# Altium footprint library MidFlg_V1_Hwork.PcbLib: 34 footprints (part 1 of 3)
Each footprint in its own frame and in the unit in brackets; x right, y up, seen from the top. Pads: shape width x height; smd on the part's side, far side on the other; paste and mask are expansions set on the pad; w line width, h text height; cw(c..) or ccw(c..) is an arc to the next point about the centre after c.
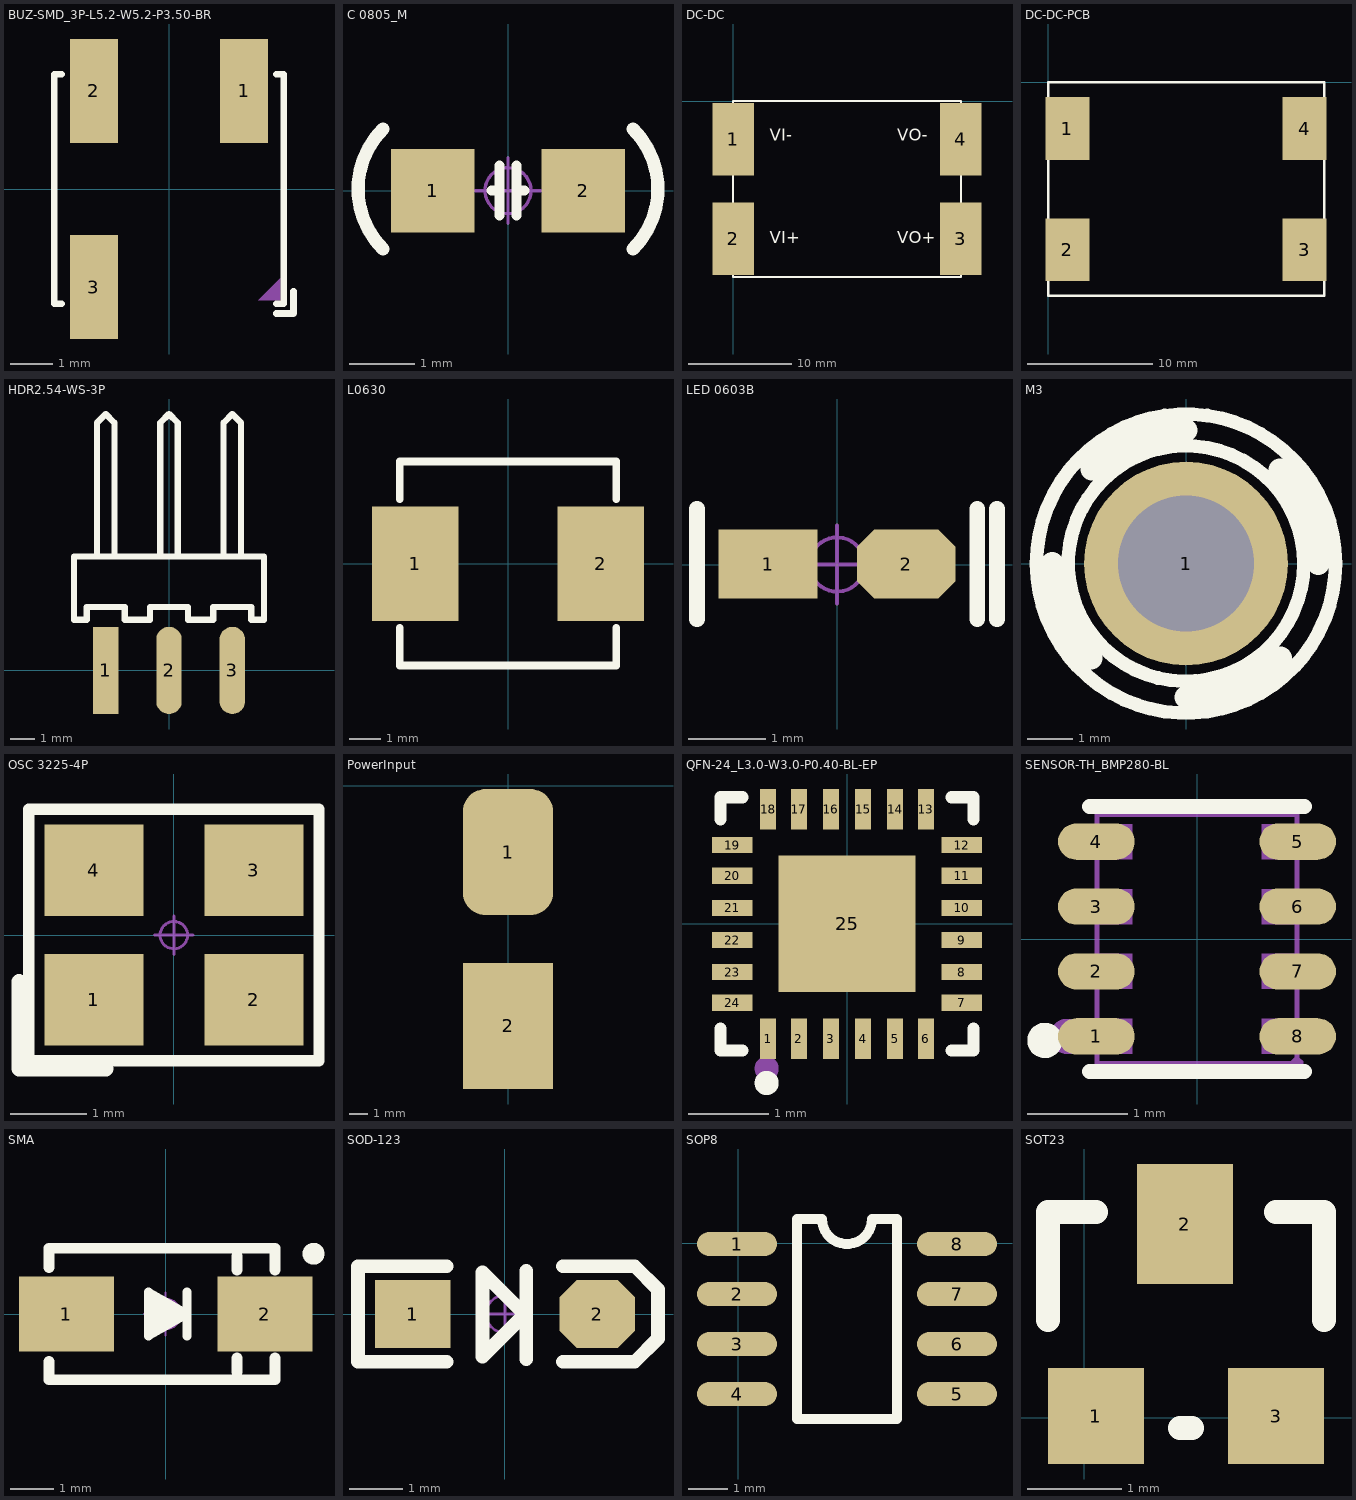
[diagram p0: the footprints below, top view; thin cyan lines are the x and y axes]

## BUZ-SMD_3P-L5.2-W5.2-P3.50-BR [mm]
pads (3):
  rect 1.12x2.425 smd: 1(1.75,2.287) 2(-1.75,2.287) 3(-1.75,-2.287)
Top Overlay:
  lines w0.152: -2.501,-2.676 -2.676,-2.676 -2.676,2.676 -2.501,2.676 ; 2.501,-2.905 2.829,-2.905 2.905,-2.905 2.905,-2.385 ; 2.501,-2.676 2.676,-2.676 2.676,2.676 2.501,2.676
Mechanical 15:
  region: 2.6,-2.6 2.6,-2.08 2.08,-2.6
3D body "MLT-5020.step": height 2.01, standoff 0, extent -2.62,-2.6 2.645,2.6

## C 0805_M [mil] "无极性贴片电容                                         淘宝ID:黄晶宝石"
height 19.68
pads (2):
  rect 50x50 smd: 1(-45,0) 2(45,0)
Top Overlay:
  lines w6: -10,0 -5,0 ; -5,-15 -5,15 ; 5,-15 5,15 ; 5,0 10,0
  lines w7.87: -75,-35 cw(c-39,1) -75,37 ; 75,-35 ccw(c39,1) 75,37
Mechanical 15:
  circle w1.97: c0,0 r13.78
  lines w1.97: -19.68,0 19.68,0 ; 0,-19.68 0,19.68
3D body "C 0805.STEP": height 20.08, standoff -0.39, extent -39.37,-24.02 39.37,24.02

## DC-DC [mm]
pads (4):
  rect 4x7 smd: 1(0,-3.683) 2(0,-13.317) 3(22,-13.317) 4(22,-3.683)
Top Overlay:
  lines w0.2: 0,-17 22,-17 22,0 0,0 0,-17
  text "VI-" at 3.556,-4.222 h2
  text "VI+" at 3.556,-14.128 h2
  text "VO+" at 15.868,-14.114 h2
  text "VO-" at 15.875,-4.208 h2
3D body: height 3, standoff 0, extent 0,-17.018 21.971,0

## DC-DC-PCB [mm]
pads (4):
  rect 3.5x5 smd: 1(1.524,-3.683) 2(1.524,-13.335) 3(20.447,-13.335) 4(20.447,-3.683)
Top Overlay:
  lines w0.2: 0,-17 22,-17 22,0 0,0 0,-17

## HDR2.54-WS-3P [mm] "3P卧式贴片排针2.54"
pads (3):
  rect 1.02x3.5 smd: 1(-2.54,0)
  oval 1.02x3.5 smd: 2(0,0) 3(2.54,0)
Top Overlay:
  lines w0.254: -2.89,4.572 -2.89,9.8 -2.89,9.937 -2.54,10.287 -2.19,9.937 -2.19,9.8 -2.19,4.572 ; -0.35,4.572 -0.35,9.8 -0.35,9.937 0,10.287 0.35,9.937 0.35,9.8 0.35,4.572 ; 2.19,4.572 2.19,9.8 2.19,9.937 2.54,10.287 2.89,9.937 2.89,9.8 2.89,4.572 ; -3.81,2.032 -3.302,2.032 -3.302,2.54 -2.032,2.54 -1.778,2.54 -1.778,2.032 -1.27,2.032 -0.762,2.032 -0.762,2.54 0.508,2.54 0.762,2.54 0.762,2.032 1.27,2.032 1.778,2.032 1.778,2.54 3.048,2.54 3.302,2.54 3.302,2.032 3.81,2.032 3.81,4.572 1.27,4.572 -1.27,4.572 -3.81,4.572 -3.81,2.032
3D body "HDR2.54 S-W-1P.STEP": height 2.54, standoff -0.01, extent 1.27,-0.76 3.81,10.34
3D body "HDR2.54 S-W-1P.STEP": height 2.54, standoff -0.01, extent -1.27,-0.76 1.27,10.34
3D body "HDR2.54 S-W-1P.STEP": height 2.54, standoff -0.01, extent -3.81,-0.76 -1.27,10.34

## L0630 [mm]
pads (2):
  rect 2.8x3.7 smd: 1(-3,0) 2(3,0)
Top Overlay:
  lines w0.254: -3.5,-2.081 -3.5,-3.3 -3.49,-3.3 3.5,-3.3 3.5,-2.081 ; -3.5,2.081 -3.5,3.3 3.48,3.3 3.5,3.28 ; 3.5,2.081 3.5,3.3
Mechanical 5:
  region: -1.9,-1.5 -3.5,-1.5 -3.5,1.5 -1.9,1.5
  region: 1.9,1.5 3.5,1.5 3.5,-1.5 1.9,-1.5
Mechanical 6:
  circle w0.06: c-3.5,-3.3 r0.03
3D body "User Library-L0630.STEP": height 3.18, standoff 0.03, extent -3.5,-3 3.5,3

## LED 0603B [mil] "蓝色0603LED                             淘宝ID:黄晶宝石"
pads (2):
  rect 50x35 smd: 1(-35,0.26)
  oct 50x35 smd: 2(35,0.26)
Top Overlay:
  lines w8: -71,-27.74 -71,-25.74 -71,28.26 ; 71,-27.74 71,28.26 ; 81,-27.74 81,28.26
Mechanical 15:
  circle w1.97: c0,0 r13.78
  lines w1.97: -19.68,0 19.68,0 ; 0,-19.68 0,19.68
3D body "LED 0603-B.STEP": height 18.36, standoff -0.16, extent -31.49,-15.79 31.5,15.79
3D body "LED 0603玻璃罩.STEP": height 23.82, standoff 8.07, extent -23.58,-15.79 23.58,15.79

## M3 [mm]
pads (1):
  round 4.5 hole 3: 1(0,0)
Top Overlay:
  circle w0.3: c0,0 r2.6
  circle w0.3: c0,0 r3.3
  lines w0.5: -2.952,0 ccw(c0,0) -2.088,-2.088 ; -2.081,2.081 cw(c0,0) 0,2.943 ; 0,-2.95 ccw(c0,0) 2.086,-2.086 ; 2.066,2.066 cw(c0,0) 2.922,0
Bottom Overlay:
  circle w0.3: c0,-0.02 r3.3
  circle w0.3: c0,-0.02 r2.6
  lines w0.5: -2.952,-0.02 ccw(c0,-0.02) -2.088,-2.108 ; -2.081,2.061 cw(c0,-0.02) 0,2.923 ; 0,-2.97 ccw(c0,-0.02) 2.086,-2.106 ; 2.066,2.046 cw(c0,-0.02) 2.922,-0.02
3D body "LQ_SCREW3X5.stp": height 1.3, standoff -8.1, extent -3,-3 3,3

## OSC 3225-4P [mm] "3.2*2.5*0.7mm(长宽高)                         淘宝ID:黄晶宝石"
pads (4):
  rect 1.3x1.2 smd: 1(-1.05,-0.85) 2(1.05,-0.85) 3(1.05,0.85) 4(-1.05,0.85)
Top Overlay:
  lines w0.15: -1.905,-1.651 -1.905,1.651 1.905,1.651 1.905,-1.651 -1.905,-1.651
  lines w0.2: -2.032,-1.753 -0.889,-1.753 ; -2.032,-1.727 -2.032,-0.61
Mechanical 15:
  circle w0.04: c0,0 r0.18
  lines w0.04: -0.254,0 0.254,0 ; 0,-0.254 0,0.254
3D body "OSC 3225-4.STEP": height 0.7, standoff -0.02, extent -1.6,-1.25 1.6,1.25

## PowerInput [mm]
pads (2):
  rrect50% 5x7 smd: 1(0,-3.683)
  rect 5x7 smd: 2(0,-13.317)

## QFN-24_L3.0-W3.0-P0.40-BL-EP [mm]
pads (25):
  rect 0.2x0.505 smd: 1(-0.981,-1.428) 2(-0.6,-1.428) 3(-0.2,-1.428) 4(0.2,-1.428) 5(0.6,-1.428) 6(0.981,-1.428) 13(0.981,1.428) 14(0.6,1.428) 15(0.2,1.428) 16(-0.2,1.428) 17(-0.6,1.428) 18(-0.981,1.428)
  rect 0.505x0.2 smd: 7(1.428,-0.981) 8(1.428,-0.6) 9(1.428,-0.2) 10(1.428,0.2) 11(1.428,0.6) 12(1.428,0.981) 19(-1.428,0.981) 20(-1.428,0.6) 21(-1.428,0.2) 22(-1.428,-0.2) 23(-1.428,-0.6) 24(-1.428,-0.981)
  rect 1.7x1.7 smd: 25(0,0)
Top Overlay:
  circle w0.15: c-1,-1.98 r0.075
  lines w0.152: -1.576,-1.303 -1.576,-1.576 -1.303,-1.576 ; -1.576,1.303 -1.576,1.576 -1.303,1.576 ; 1.303,-1.576 1.576,-1.576 1.576,-1.303 ; 1.303,1.576 1.576,1.576 1.576,1.303
Mechanical 15:
  circle w0.15: c-1,-1.8 r0.075
3D body "QFN-24_L3.0-W3.0-P0.STEP": height 0.9, standoff 0, extent -1.5,-1.5 1.5,1.5

## SENSOR-TH_BMP280-BL [mm]
pads (8):
  oval 0.767x0.363 smd mask+0.051: 1(-1.008,-0.975) 2(-1.008,-0.325) 3(-1.008,0.325) 4(-1.008,0.975) 5(1.008,0.975) 6(1.008,0.325) 7(1.008,-0.325) 8(1.008,-0.975)
Top Overlay:
  circle w0.175: c-1.524,-1.016 r0.089
  lines w0.152: -1.077,-1.326 1.077,-1.326 ; -1.077,1.326 1.077,1.326
Mechanical 6:
  circle w0.175: c-1.3,-0.975 r0.089
Mechanical 15:
  region: -1.001,-1.151 -0.65,-1.151 -0.65,-0.8 -1.001,-0.8
  region: -1.001,-0.5 -0.65,-0.5 -0.65,-0.15 -1.001,-0.15
  region: -1.001,0.15 -0.65,0.15 -0.65,0.5 -1.001,0.5
  region: -1.001,0.8 -0.65,0.8 -0.65,1.151 -1.001,1.151
  region: 1.001,0.8 0.65,0.8 0.65,1.151 1.001,1.151
  region: 1.001,0.15 0.65,0.15 0.65,0.5 1.001,0.5
  region: 1.001,-0.5 0.65,-0.5 0.65,-0.15 1.001,-0.15
  region: 1.001,-1.151 0.65,-1.151 0.65,-0.8 1.001,-0.8
  region: 1.062,-1.25 1.062,-1.224 1.026,-1.189 0.976,-1.189 0.94,-1.224 0.94,-1.25 0.94,-1.275 0.976,-1.311 1.026,-1.311 1.062,-1.275
  lines w0.051: -1.001,-1.25 -1.001,1.25 1.001,1.25 1.001,-1.25 -1.001,-1.25
3D body "SENSOR-TH_BMP280-BL.STEP": height 0.97, standoff 0, extent -0.999,-1.249 0.999,1.249

## SMA [mm] "4.5x2.6*2.2mm（长宽高，不包括引脚）"
height 2.54
pads (2):
  rect 2.2x1.75 smd: 1(-2.3,0) 2(2.3,0)
Top Overlay:
  circle w0.254: c3.429,1.397 r0.127
  lines w0.203: 0.494,-0.508 0.494,0.508 ; -0.395,-0.508 0.494,0 -0.395,0.508 -0.395,-0.508
  lines w0.254: -2.7,-1.105 -2.7,-1.524 2.54,-1.524 2.54,-1.016 ; -2.7,1.08 -2.7,1.524 2.54,1.524 2.54,1.016 ; -0.33,0.305 0.305,0 -0.254,-0.305 -0.254,0.051 0.023,0 ; 1.651,-1.35 1.651,-1.016 ; 1.651,1.016 1.651,1.35
Mechanical 15:
  circle w0.05: c0,0 r0.35
  lines w0.05: -0.5,0 0.5,0 ; 0,-0.5 0,0.5
3D body "SMA.STEP": height 2.15, standoff 0.04, extent -2.528,-1.3 2.575,1.3

## SOD-123 [mil] "2.7x1.6X1.1mm（长宽高，不包括引脚） 淘宝ID:黄晶宝石"
pads (2):
  rect 55x50 smd: 1(-67.5,0)
  oct 55x50 smd: 2(67.5,0)
Top Overlay:
  lines w10: -42.5,-35 -107.5,-35 -107.5,35 -42.5,35 ; 14,-0.8 -16.4,-31.2 -16.4,30.5 15.6,-1.5 ; 15.6,-33.1 15.6,31.7 ; 42.5,-35 95,-35 112,-18 112,18 95,35 42.5,35
Mechanical 15:
  circle w1.97: c0,0 r13.78
  lines w1.97: -19.68,0 19.68,0 ; 0,-19.68 0,19.68
3D body "SOD-123.STEP": height 48.03, standoff 0, extent -72.84,-31.5 72.83,31.5

## SOP8 [mil] "封装库来自淘宝卖家 ID：黄晶宝石"
pads (8):
  oval 80x24 smd: 1(-1,-1) 2(-1,-51) 3(-1,-101) 4(-1,-151) 5(219,-151) 6(219,-101) 7(219,-51) 8(219,-1)
Top Overlay:
  lines w10: 59,-176 159,-176 159,24 134,24 cw(c109,24) 84,24 59,24 59,-176
3D body "SOP8.STEP": height 62.99, standoff 0, extent -3.93,-173.82 233.94,23.82

## SOT23 [mil] "封装库来自淘宝卖家 ID：黄晶宝石"
pads (3):
  rect 40x40 smd: 1(4.88,0.63) 3(79.88,0.63)
  rect 40x50 smd: 2(41.88,80.63)
Top Overlay:
  lines w10: -15.12,40.63 -15.12,85.63 4.88,85.63 ; 39.88,-4.37 44.88,-4.37 ; 79.88,85.63 99.88,85.63 99.88,40.63
3D body "SOT-23-3.STEP": height 47.24, standoff 0, extent -14.87,-11.02 99.3,99.22